# Altium schematic symbol library FPGA_Xilinx_Virtex7.SchLib: 34 symbols (part 18 of 26)
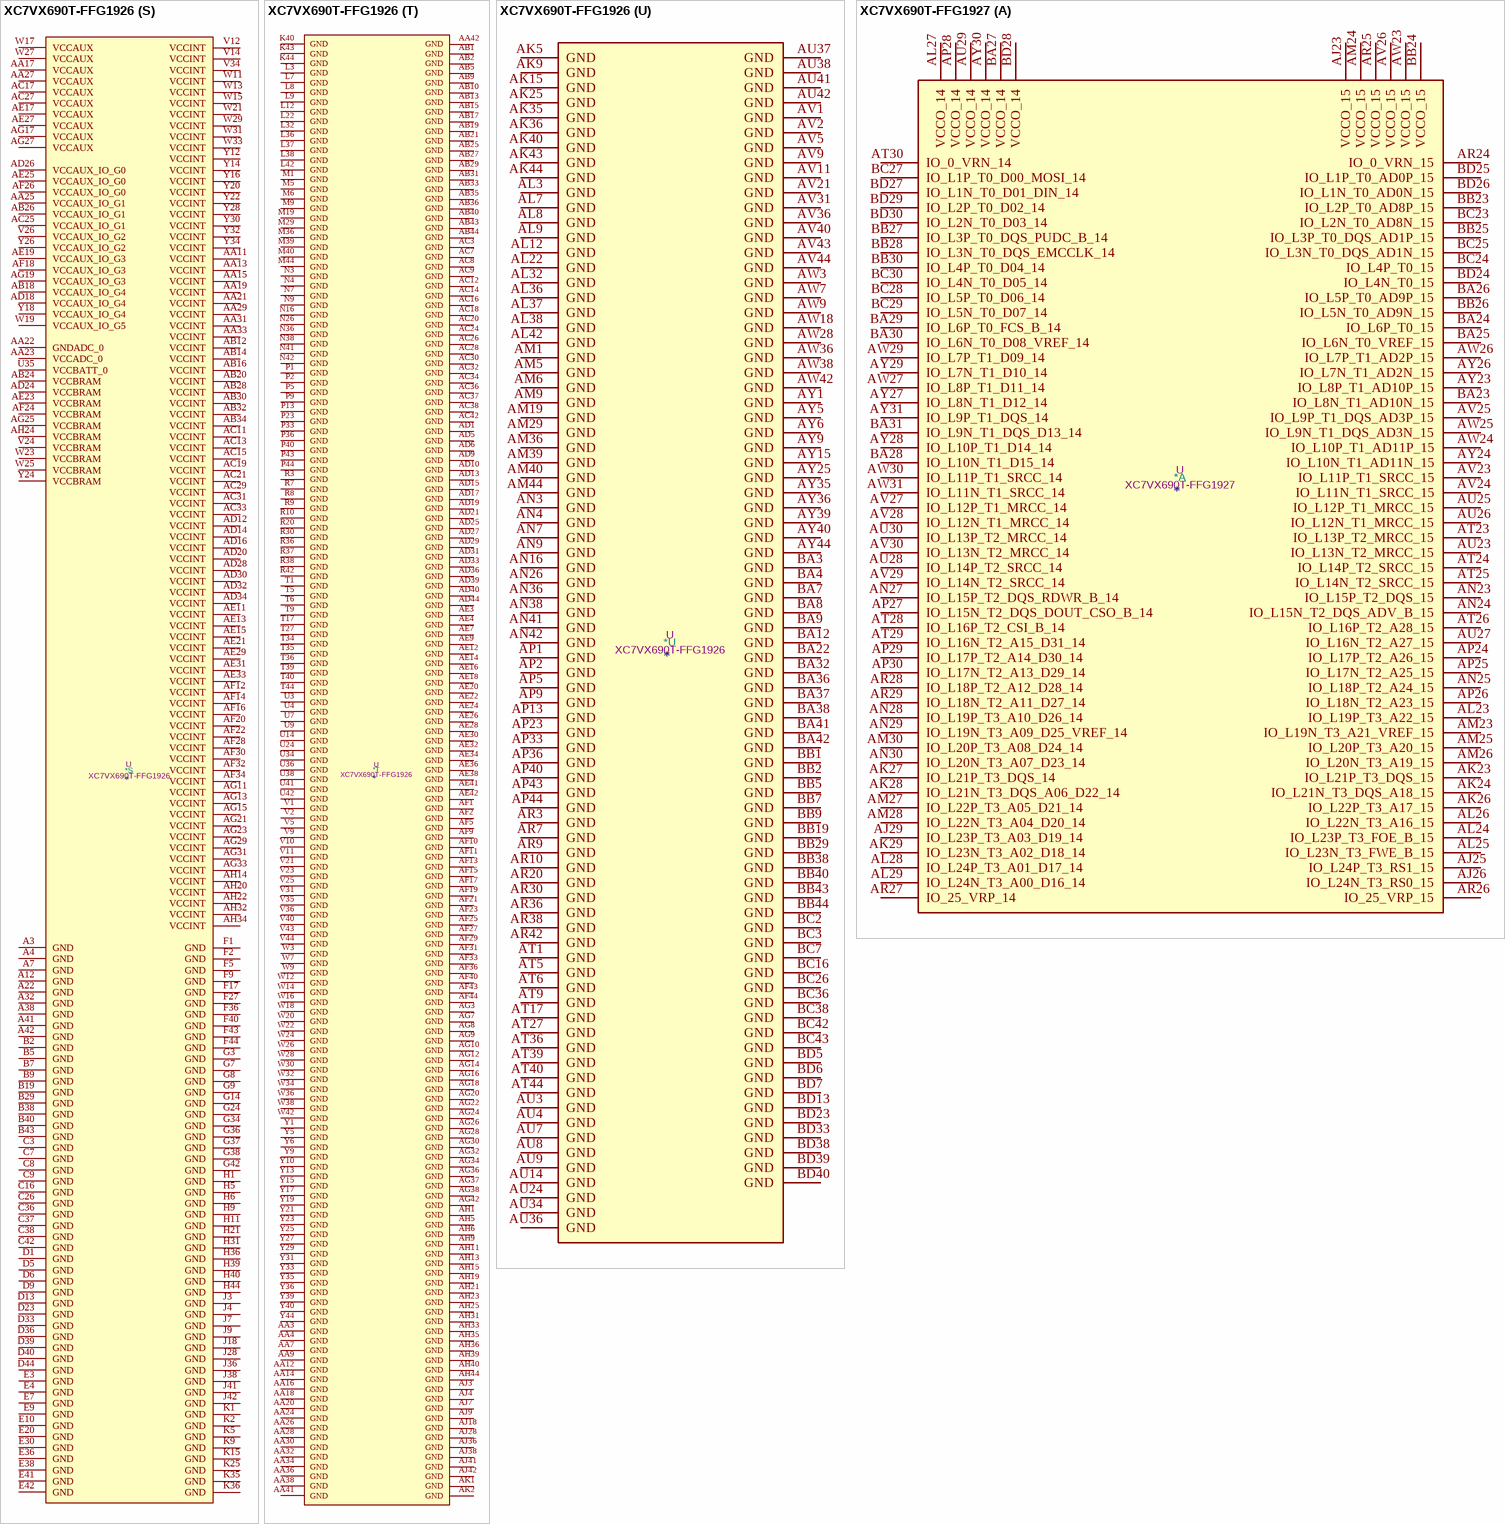
[diagram p189: symbols XC7VX690T-FFG1926 to XC7VX690T-FFG1927]

## XC7VX690T-FFG1926
designator *  value XC7VX690T-FFG1926  Reference: U
ki_keywords: FPGA; ki_description: Virtex 7 XT 690 XC7VX690T-FFG1926
part A pins: AH26 VCCO_11, AH27 IO_L1P_T0_11, AH28 IO_L1N_T0_11, AH29 IO_L3P_T0_DQS_11, AH30 IO_0_VRN_10, AJ26 IO_L2P_T0_11, AJ27 IO_L2N_T0_11, AJ29 IO_L3N_T0_DQS_11, AJ30 IO_L2P_T0_10, AJ31 IO_L2N_T0_10, AK26 IO_L6P_T0_11, AK27 IO_L4P_T0_11, AK28 IO_L4N_T0_11, AK29 IO_L5P_T0_11, AK30 VCCO_10, AK31 IO_L1P_T0_10, AL25 IO_0_VRN_11, AL26 IO_L6N_T0_VREF_11, AL27 VCCO_11, AL28 IO_25_VRP_11, AL29 IO_L5N_T0_11, AL30 IO_L4P_T0_10, AL31 IO_L1N_T0_10, AM25 IO_L8P_T1_11, AM26 IO_L8N_T1_11, AM27 IO_L7P_T1_11, AM28 IO_L7N_T1_11, AM30 IO_L3P_T0_DQS_10, AM31 IO_L4N_T0_10, AM32 IO_L5P_T0_10, AN25 IO_L10P_T1_11, AN27 IO_L9P_T1_DQS_11, AN28 IO_L9N_T1_DQS_11, AN29 IO_L6P_T0_10, AN30 IO_L3N_T0_DQS_10, AN31 VCCO_10, AN32 IO_L5N_T0_10, AP25 IO_L10N_T1_11, AP26 IO_L12P_T1_MRCC_11, AP27 IO_L12N_T1_MRCC_11, AP28 VCCO_11, AP29 IO_25_VRP_10, AP30 IO_L6N_T0_VREF_10, AP31 IO_L15P_T2_DQS_10, AR25 VCCO_11, AR26 IO_L13P_T2_MRCC_11, AR27 IO_L11P_T1_SRCC_11, AR28 IO_L11N_T1_SRCC_11, AR29 IO_L16P_T2_10, AR31 IO_L15N_T2_DQS_10, AT25 IO_L14P_T2_SRCC_11, AT26 IO_L13N_T2_MRCC_11, AT28 IO_L18P_T2_10, AT29 IO_L18N_T2_10, AT30 IO_L16N_T2_10, AT31 IO_L17P_T2_10, AU25 IO_L15P_T2_DQS_11, AU26 IO_L14N_T2_SRCC_11, AU27 IO_L18P_T2_11, AU28 IO_L14P_T2_SRCC_10, AU29 VCCO_10, AU30 IO_L13P_T2_MRCC_10, AU31 IO_L17N_T2_10, AV25 IO_L15N_T2_DQS_11, AV26 VCCO_11, AV27 IO_L18N_T2_11, AV28 IO_L14N_T2_SRCC_10, AV29 IO_L11P_T1_SRCC_10, AV30 IO_L13N_T2_MRCC_10, AW25 IO_L17P_T2_11, AW26 IO_L17N_T2_11, AW27 IO_L16P_T2_11, AW29 IO_L11N_T1_SRCC_10, AW30 IO_L12P_T1_MRCC_10, AW31 IO_L12N_T1_MRCC_10, AY26 IO_L19P_T3_11, AY27 IO_L16N_T2_11, AY28 IO_L7P_T1_10, AY29 IO_L9P_T1_DQS_10, AY30 VCCO_10, AY31 IO_L10P_T1_10, AY32 IO_L10N_T1_10, BA25 IO_L22P_T3_11, BA26 IO_L19N_T3_VREF_11, BA27 VCCO_11, BA28 IO_L7N_T1_10, BA29 IO_L9N_T1_DQS_10, BA30 IO_L8P_T1_10, BA31 IO_L8N_T1_10, BB24 VCCO_11, BB25 IO_L22N_T3_11, BB26 IO_L23P_T3_11, BB27 IO_L23N_T3_11, BB28 IO_L20P_T3_10, BB30 IO_L19P_T3_10, BB31 IO_L19N_T3_VREF_10, BB32 IO_L23P_T3_10, BC25 IO_L21P_T3_DQS_11, BC27 IO_L24P_T3_11, BC28 IO_L20N_T3_10, BC29 IO_L22P_T3_10, BC30 IO_L24P_T3_10, BC31 VCCO_10, BC32 IO_L23N_T3_10, BD24 IO_L20P_T3_11, BD25 IO_L20N_T3_11, BD26 IO_L21N_T3_DQS_11, BD27 IO_L24N_T3_11, BD28 VCCO_10, BD29 IO_L22N_T3_10, BD30 IO_L24N_T3_10, BD31 IO_L21P_T3_DQS_10, BD32 IO_L21N_T3_DQS_10
part B pins: A23 IO_L24P_T3_13, A24 IO_L24N_T3_13, A25 IO_L22P_T3_13, A26 IO_L22N_T3_13, AJ21 IO_0_VRN_12, AJ22 IO_L4P_T0_12, AJ23 VCCO_12, AJ24 IO_L1N_T0_12, AJ25 IO_L1P_T0_12, AK21 IO_L2P_T0_12, AK22 IO_L4N_T0_12, AK23 IO_L3N_T0_DQS_12, AK24 IO_L3P_T0_DQS_12, AL21 IO_L2N_T0_12, AL23 IO_L5P_T0_12, AL24 IO_25_VRP_12, AM21 IO_L6N_T0_VREF_12, AM22 IO_L6P_T0_12, AM23 IO_L5N_T0_12, AM24 VCCO_12, AN21 VCCO_12, AN22 IO_L10N_T1_12, AN23 IO_L10P_T1_12, AN24 IO_L7P_T1_12, AP21 IO_L8N_T1_12, AP22 IO_L8P_T1_12, AP24 IO_L7N_T1_12, AR21 IO_L12N_T1_MRCC_12, AR22 IO_L12P_T1_MRCC_12, AR23 IO_L9N_T1_DQS_12, AR24 IO_L9P_T1_DQS_12, AT21 IO_L13P_T2_MRCC_12, AT22 VCCO_12, AT23 IO_L11N_T1_SRCC_12, AT24 IO_L11P_T1_SRCC_12, AU21 IO_L13N_T2_MRCC_12, AU22 IO_L14N_T2_SRCC_12, AU23 IO_L14P_T2_SRCC_12, AV22 IO_L16N_T2_12, AV23 IO_L16P_T2_12, AV24 IO_L18P_T2_12, AW21 IO_L15N_T2_DQS_12, AW22 IO_L15P_T2_DQS_12, AW23 VCCO_12, AW24 IO_L18N_T2_12, AY21 IO_L17N_T2_12, AY22 IO_L17P_T2_12, AY23 IO_L19N_T3_VREF_12, AY24 IO_L19P_T3_12, B24 VCCO_13, B25 IO_L20P_T3_13, B26 IO_L20N_T3_13, BA21 IO_L20P_T3_12, BA23 IO_L21N_T3_DQS_12, BA24 IO_L21P_T3_DQS_12, BB21 IO_L20N_T3_12, BB22 IO_L23N_T3_12, BB23 IO_L23P_T3_12, BC21 VCCO_12, BC22 IO_L22P_T3_12, BC23 IO_L24N_T3_12, BC24 IO_L24P_T3_12, BD22 IO_L22N_T3_12, C24 IO_L23P_T3_13, C25 IO_L23N_T3_13, D24 IO_L21P_T3_DQS_13, D25 IO_L21N_T3_DQS_13, D26 IO_L19N_T3_VREF_13, E24 IO_L18N_T2_13, E25 VCCO_13, E26 IO_L19P_T3_13, F24 IO_L18P_T2_13, F25 IO_L16P_T2_13, F26 IO_L16N_T2_13, G25 IO_L17P_T2_13, G26 IO_L17N_T2_13, H24 IO_L15P_T2_DQS_13, H25 IO_L15N_T2_DQS_13, H26 VCCO_13, H27 IO_L13N_T2_MRCC_13, J24 IO_L14P_T2_SRCC_13, J25 IO_L14N_T2_SRCC_13, J26 IO_L11N_T1_SRCC_13, J27 IO_L13P_T2_MRCC_13, K24 IO_L9N_T1_DQS_13, K26 IO_L11P_T1_SRCC_13, K27 IO_L12N_T1_MRCC_13, L24 IO_L9P_T1_DQS_13, L25 IO_L7N_T1_13, L26 IO_L12P_T1_MRCC_13, L27 VCCO_13, M24 VCCO_13, M25 IO_L7P_T1_13, M26 IO_L10P_T1_13, M27 IO_L10N_T1_13, N24 IO_L8P_T1_13, N25 IO_L8N_T1_13, N27 IO_0_VRN_13, P24 IO_L5P_T0_13, P25 IO_L5N_T0_13, P26 IO_L3P_T0_DQS_13, P27 IO_L3N_T0_DQS_13, R24 IO_L6N_T0_VREF_13, R25 VCCO_13, R26 IO_L1P_T0_13, R27 IO_L1N_T0_13, T24 IO_L6P_T0_13, T25 IO_L4P_T0_13, T26 IO_L4N_T0_13, U25 IO_25_VRP_13, U26 IO_L2P_T0_13, U27 IO_L2N_T0_13
part C pins: A31 IO_L1N_T0_AD0N_15, AJ32 IO_L4P_T0_D04_14, AJ33 VCCO_14, AJ34 IO_L2P_T0_D02_14, AJ35 IO_0_VRN_14, AK32 IO_L4N_T0_D05_14, AK33 IO_L6P_T0_FCS_B_14, AK34 IO_L2N_T0_D03_14, AL33 IO_L3P_T0_DQS_PUDC_B_14, AL34 IO_L6N_T0_D08_VREF_14, AL35 IO_L5P_T0_D06_14, AM33 IO_L3N_T0_DQS_EMCCLK_14, AM34 VCCO_14, AM35 IO_L5N_T0_D07_14, AN33 IO_25_VRP_14, AN34 IO_L1P_T0_D00_MOSI_14, AN35 IO_L1N_T0_D01_DIN_14, AP32 IO_L7P_T1_D09_14, AP34 IO_L8P_T1_D11_14, AP35 IO_L8N_T1_D12_14, AR32 IO_L7N_T1_D10_14, AR33 IO_L10P_T1_D14_14, AR34 IO_L10N_T1_D15_14, AR35 VCCO_14, AT32 VCCO_14, AT33 IO_L9P_T1_DQS_14, AT34 IO_L9N_T1_DQS_D13_14, AT35 IO_L12P_T1_MRCC_14, AU32 IO_L11P_T1_SRCC_14, AU33 IO_L11N_T1_SRCC_14, AU35 IO_L12N_T1_MRCC_14, AV32 IO_L14P_T2_SRCC_14, AV33 IO_L13P_T2_MRCC_14, AV34 IO_L13N_T2_MRCC_14, AV35 IO_L15P_T2_DQS_RDWR_B_14, AW32 IO_L14N_T2_SRCC_14, AW33 VCCO_14, AW34 IO_L17P_T2_A14_D30_14, AW35 IO_L15N_T2_DQS_DOUT_CSO_B_14, AY33 IO_L16P_T2_CSI_B_14, AY34 IO_L17N_T2_A13_D29_14, B31 IO_L1P_T0_AD0P_15, B32 IO_L3N_T0_DQS_AD1N_15, BA33 IO_L16N_T2_A15_D31_14, BA34 IO_L18P_T2_A12_D28_14, BA35 IO_L18N_T2_A11_D27_14, BB33 IO_L20P_T3_A08_D24_14, BB34 VCCO_14, BB35 IO_L19P_T3_A10_D26_14, BB36 IO_L19N_T3_A09_D25_VREF_14, BB37 IO_L21P_T3_DQS_14, BC33 IO_L20N_T3_A07_D23_14, BC34 IO_L22P_T3_A05_D21_14, BC35 IO_L22N_T3_A04_D20_14, BC37 IO_L21N_T3_DQS_A06_D22_14, BD34 IO_L24P_T3_A01_D17_14, BD35 IO_L24N_T3_A00_D16_14, BD36 IO_L23P_T3_A03_D19_14, BD37 IO_L23N_T3_A02_D18_14, C31 VCCO_15, C32 IO_L3P_T0_DQS_AD1P_15, D31 IO_L5N_T0_AD9N_15, D32 IO_L4N_T0_15, E31 IO_L5P_T0_AD9P_15, E32 IO_L4P_T0_15, F31 IO_L2N_T0_AD8N_15, F32 VCCO_15, G31 IO_L2P_T0_AD8P_15, G32 IO_L6P_T0_15, G33 IO_L6N_T0_VREF_15, H32 IO_L9N_T1_DQS_AD3N_15, H33 IO_L8P_T1_AD10P_15, H34 IO_L8N_T1_AD10N_15, J31 IO_L7N_T1_AD2N_15, J32 IO_L9P_T1_DQS_AD3P_15, J33 VCCO_15, J34 IO_L10P_T1_AD11P_15, J35 IO_L10N_T1_AD11N_15, K31 IO_L7P_T1_AD2P_15, K32 IO_L11N_T1_SRCC_15, K33 IO_L12P_T1_MRCC_15, K34 IO_L12N_T1_MRCC_15, L31 IO_L11P_T1_SRCC_15, L33 IO_L13P_T2_MRCC_15, L34 IO_L13N_T2_MRCC_15, L35 IO_L16N_T2_A27_15, M31 IO_L14P_T2_SRCC_15, M32 IO_L14N_T2_SRCC_15, M33 IO_L18N_T2_A23_15, M34 VCCO_15, M35 IO_L16P_T2_A28_15, N31 VCCO_15, N32 IO_L17N_T2_A25_15, N33 IO_L18P_T2_A24_15, N34 IO_L15P_T2_DQS_15, N35 IO_L15N_T2_DQS_ADV_B_15, P31 IO_L20N_T3_A19_15, P32 IO_L17P_T2_A26_15, P34 IO_L24N_T3_RS0_15, P35 IO_0_VRN_15, R31 IO_L20P_T3_A20_15, R32 IO_L22P_T3_A17_15, R33 IO_L22N_T3_A16_15, R34 IO_L24P_T3_RS1_15, R35 VCCO_15, T31 IO_L19N_T3_A21_VREF_15, T32 VCCO_15, T33 IO_L21N_T3_DQS_A18_15, U31 IO_L19P_T3_A22_15, U32 IO_L21P_T3_DQS_15, U33 IO_L23N_T3_FWE_B_15, V32 IO_25_VRP_15, V33 IO_L23P_T3_FOE_B_15
part D pins: A27 VCCO_16, A28 IO_L24P_T3_16, A29 IO_L24N_T3_16, A30 IO_L23N_T3_16, A33 IO_L16P_T2_17, A34 IO_L16N_T2_17, A35 IO_L15P_T2_DQS_17, A36 IO_L15N_T2_DQS_17, A37 VCCO_17, B27 IO_L22P_T3_16, B28 IO_L22N_T3_16, B30 IO_L23P_T3_16, B33 IO_L6N_T0_VREF_17, B34 VCCO_17, B35 IO_L18P_T2_17, B36 IO_L17P_T2_17, B37 IO_L17N_T2_17, C27 IO_L20P_T3_16, C28 IO_L20N_T3_16, C29 IO_L21P_T3_DQS_16, C30 IO_L21N_T3_DQS_16, C33 IO_L12P_T1_MRCC_17, C34 IO_L12N_T1_MRCC_17, C35 IO_L11N_T1_SRCC_17, D27 IO_L18N_T2_16, D28 VCCO_16, D29 IO_L19P_T3_16, D30 IO_L19N_T3_VREF_16, D34 IO_L13N_T2_MRCC_17, D35 IO_L11P_T1_SRCC_17, E27 IO_L18P_T2_16, E28 IO_L16P_T2_16, E29 IO_L16N_T2_16, E33 IO_L13P_T2_MRCC_17, E34 IO_L14N_T2_SRCC_17, E35 VCCO_17, F28 IO_L17P_T2_16, F29 IO_L17N_T2_16, F30 IO_L15N_T2_DQS_16, F33 IO_0_VRN_17, F34 IO_L14P_T2_SRCC_17, F35 IO_L19N_T3_VREF_17, G27 IO_L14P_T2_SRCC_16, G28 IO_L14N_T2_SRCC_16, G29 VCCO_16, G30 IO_L15P_T2_DQS_16, G35 IO_L19P_T3_17, H28 IO_L13P_T2_MRCC_16, H29 IO_L13N_T2_MRCC_16, H30 IO_L11N_T1_SRCC_16, H35 IO_25_VRP_17, J29 IO_L12N_T1_MRCC_16, J30 IO_L11P_T1_SRCC_16, K28 IO_L10N_T1_16, K29 IO_L12P_T1_MRCC_16, K30 VCCO_16, L28 IO_L10P_T1_16, L29 IO_L9P_T1_DQS_16, L30 IO_L9N_T1_DQS_16, M28 IO_L8N_T1_16, M30 IO_L7N_T1_16, N28 IO_L8P_T1_16, N29 IO_L6N_T0_VREF_16, N30 IO_L7P_T1_16, P28 VCCO_16, P29 IO_L6P_T0_16, P30 IO_25_VRP_16, R28 IO_L4P_T0_16, R29 IO_L4N_T0_16, T28 IO_L2P_T0_16, T29 IO_L2N_T0_16, T30 IO_L5N_T0_16, U28 IO_L3N_T0_DQS_16, U29 VCCO_16, U30 IO_L5P_T0_16, V27 IO_0_VRN_16, V28 IO_L3P_T0_DQS_16, V29 IO_L1P_T0_16, V30 IO_L1N_T0_16
part E pins: AH16 VCCO_30, AH17 IO_L2N_T0_31, AH18 IO_L2P_T0_31, AJ14 IO_0_VRN_30, AJ15 IO_L2N_T0_30, AJ16 IO_L2P_T0_30, AJ17 IO_0_VRN_31, AJ19 IO_L4N_T0_31, AJ20 IO_L4P_T0_31, AK14 IO_L4P_T0_30, AK16 IO_L1P_T0_30, AK17 IO_L1N_T0_31, AK18 IO_L1P_T0_31, AK19 IO_L6P_T0_31, AK20 VCCO_31, AL14 IO_L4N_T0_30, AL15 IO_L3P_T0_DQS_30, AL16 IO_L1N_T0_30, AL17 VCCO_31, AL18 IO_L3P_T0_DQS_31, AL19 IO_L6N_T0_VREF_31, AL20 IO_L5P_T0_31, AM14 VCCO_30, AM15 IO_L3N_T0_DQS_30, AM16 IO_25_VRP_30, AM17 IO_L10P_T1_31, AM18 IO_L3N_T0_DQS_31, AM20 IO_L5N_T0_31, AN14 IO_L5N_T0_30, AN15 IO_L5P_T0_30, AN17 IO_L10N_T1_31, AN18 IO_L7N_T1_31, AN19 IO_L7P_T1_31, AN20 IO_25_VRP_31, AP14 IO_L15P_T2_DQS_30, AP15 IO_L6N_T0_VREF_30, AP16 IO_L6P_T0_30, AP17 IO_L8P_T1_31, AP18 VCCO_31, AP19 IO_L9N_T1_DQS_31, AP20 IO_L9P_T1_DQS_31, AR14 IO_L15N_T2_DQS_30, AR15 VCCO_30, AR16 IO_L16P_T2_30, AR17 IO_L8N_T1_31, AR18 IO_L11N_T1_SRCC_31, AR19 IO_L11P_T1_SRCC_31, AT13 IO_L17N_T2_30, AT14 IO_L17P_T2_30, AT15 IO_L16N_T2_30, AT16 IO_L18P_T2_30, AT18 IO_L12N_T1_MRCC_31, AT19 IO_L12P_T1_MRCC_31, AT20 IO_L13P_T2_MRCC_31, AU13 IO_L13P_T2_MRCC_30, AU15 IO_L14P_T2_SRCC_30, AU16 IO_L18N_T2_30, AU17 IO_L14N_T2_SRCC_31, AU18 IO_L14P_T2_SRCC_31, AU19 VCCO_31, AU20 IO_L13N_T2_MRCC_31, AV13 IO_L13N_T2_MRCC_30, AV14 IO_L12P_T1_MRCC_30, AV15 IO_L14N_T2_SRCC_30, AV16 VCCO_30, AV17 IO_L17P_T2_31, AV18 IO_L15N_T2_DQS_31, AV19 IO_L15P_T2_DQS_31, AV20 IO_L16P_T2_31, AW13 VCCO_30, AW14 IO_L12N_T1_MRCC_30, AW15 IO_L11N_T1_SRCC_30, AW16 IO_L11P_T1_SRCC_30, AW17 IO_L17N_T2_31, AW19 IO_L18P_T2_31, AW20 IO_L16N_T2_31, AY13 IO_L10P_T1_30, AY14 IO_L8P_T1_30, AY16 IO_L7N_T1_30, AY17 IO_L7P_T1_30, AY18 IO_L19P_T3_31, AY19 IO_L18N_T2_31, AY20 VCCO_31, BA13 IO_L10N_T1_30, BA14 IO_L8N_T1_30, BA15 IO_L9N_T1_DQS_30, BA16 IO_L9P_T1_DQS_30, BA17 VCCO_30, BA18 IO_L19N_T3_VREF_31, BA19 IO_L21N_T3_DQS_31, BA20 IO_L21P_T3_DQS_31, BB13 IO_L23P_T3_30, BB14 VCCO_30, BB15 IO_L19N_T3_VREF_30, BB16 IO_L19P_T3_30, BB17 IO_L20P_T3_30, BB18 IO_L23P_T3_31, BB20 IO_L20P_T3_31, BC13 IO_L23N_T3_30, BC14 IO_L24N_T3_30, BC15 IO_L24P_T3_30, BC17 IO_L20N_T3_30, BC18 IO_L23N_T3_31, BC19 IO_L24P_T3_31, BC20 IO_L20N_T3_31, BD14 IO_L21N_T3_DQS_30, BD15 IO_L21P_T3_DQS_30, BD16 IO_L22N_T3_30, BD17 IO_L22P_T3_30, BD18 VCCO_31, BD19 IO_L24N_T3_31, BD20 IO_L22N_T3_31, BD21 IO_L22P_T3_31
part F pins: A20 IO_L24N_T3_33, A21 IO_L24P_T3_33, AH10 IO_0_VRN_32, AH12 IO_L2P_T0_32, AJ10 IO_L4N_T0_32, AJ11 IO_L4P_T0_32, AJ12 IO_L2N_T0_32, AJ13 VCCO_32, AK10 VCCO_32, AK11 IO_L1P_T0_32, AK12 IO_L6N_T0_VREF_32, AK13 IO_L6P_T0_32, AL10 IO_L3P_T0_DQS_32, AL11 IO_L1N_T0_32, AL13 IO_25_VRP_32, AM10 IO_L3N_T0_DQS_32, AM11 IO_L5N_T0_32, AM12 IO_L5P_T0_32, AM13 IO_L8P_T1_32, AN10 IO_L7P_T1_32, AN11 VCCO_32, AN12 IO_L10P_T1_32, AN13 IO_L8N_T1_32, AP10 IO_L7N_T1_32, AP11 IO_L9P_T1_DQS_32, AP12 IO_L10N_T1_32, AR11 IO_L9N_T1_DQS_32, AR12 IO_L12N_T1_MRCC_32, AR13 IO_L12P_T1_MRCC_32, AT10 IO_L11N_T1_SRCC_32, AT11 IO_L11P_T1_SRCC_32, AT12 VCCO_32, AU10 IO_L13N_T2_MRCC_32, AU11 IO_L13P_T2_MRCC_32, AU12 IO_L14P_T2_SRCC_32, AV10 IO_L15P_T2_DQS_32, AV12 IO_L14N_T2_SRCC_32, AW10 IO_L15N_T2_DQS_32, AW11 IO_L16P_T2_32, AW12 IO_L18P_T2_32, AY10 VCCO_32, AY11 IO_L16N_T2_32, AY12 IO_L18N_T2_32, B20 IO_L23N_T3_33, B21 IO_L23P_T3_33, B22 IO_L20N_T3_33, B23 IO_L22N_T3_33, BA10 IO_L17N_T2_32, BA11 IO_L17P_T2_32, BB8 IO_L21P_T3_DQS_32, BB10 IO_L19N_T3_VREF_32, BB11 IO_L19P_T3_32, BB12 IO_L22P_T3_32, BC8 IO_L21N_T3_DQS_32, BC9 IO_L23N_T3_32, BC10 IO_L23P_T3_32, BC11 VCCO_32, BC12 IO_L22N_T3_32, BD8 VCCO_32, BD9 IO_L20N_T3_32, BD10 IO_L20P_T3_32, BD11 IO_L24N_T3_32, BD12 IO_L24P_T3_32, C21 VCCO_33, C22 IO_L20P_T3_33, C23 IO_L22P_T3_33, D21 IO_L21N_T3_DQS_33, D22 IO_L21P_T3_DQS_33, E21 IO_L19N_T3_VREF_33, E22 IO_L19P_T3_33, E23 IO_L18N_T2_33, F21 IO_L15N_T2_DQS_33, F22 VCCO_33, F23 IO_L18P_T2_33, G21 IO_L15P_T2_DQS_33, G22 IO_L17N_T2_33, G23 IO_L16N_T2_33, H22 IO_L17P_T2_33, H23 IO_L16P_T2_33, J21 IO_L13N_T2_MRCC_33, J22 IO_L13P_T2_MRCC_33, J23 VCCO_33, K20 VCCO_33, K21 IO_L12N_T1_MRCC_33, K22 IO_L14N_T2_SRCC_33, K23 IO_L14P_T2_SRCC_33, L20 IO_L10N_T1_33, L21 IO_L12P_T1_MRCC_33, L23 IO_L11N_T1_SRCC_33, M20 IO_L10P_T1_33, M21 IO_L7N_T1_33, M22 IO_L7P_T1_33, M23 IO_L11P_T1_SRCC_33, N20 IO_L8N_T1_33, N21 VCCO_33, N22 IO_L9N_T1_DQS_33, N23 IO_L9P_T1_DQS_33, P20 IO_L8P_T1_33, P21 IO_L6N_T0_VREF_33, P22 IO_L1N_T0_33, R21 IO_L6P_T0_33, R22 IO_L1P_T0_33, R23 IO_25_VRP_33, T20 IO_L2N_T0_33, T21 IO_L4N_T0_33, T22 VCCO_33, T23 IO_L3N_T0_DQS_33, U20 IO_L2P_T0_33, U21 IO_L4P_T0_33, U22 IO_L5N_T0_33, U23 IO_L3P_T0_DQS_33, V20 IO_0_VRN_33, V22 IO_L5P_T0_33
part G pins: A13 IO_L2N_T0_34, A14 IO_L5N_T0_34, A15 IO_L5P_T0_34, A16 IO_L1N_T0_34, A17 VCCO_35, A18 IO_L24N_T3_35, A19 IO_L24P_T3_35, B12 IO_L4N_T0_34, B13 IO_L2P_T0_34, B14 VCCO_34, B15 IO_L3N_T0_DQS_34, B16 IO_L1P_T0_34, B17 IO_L23N_T3_35, B18 IO_L23P_T3_35, C12 IO_L4P_T0_34, C13 IO_L6N_T0_VREF_34, C14 IO_L6P_T0_34, C15 IO_L3P_T0_DQS_34, C17 IO_L21N_T3_DQS_35, C18 IO_L21P_T3_DQS_35, C19 IO_L22N_T3_35, C20 IO_L22P_T3_35, D14 IO_L10N_T1_34, D15 IO_L10P_T1_34, D16 IO_L19N_T3_VREF_35, D17 IO_L19P_T3_35, D18 VCCO_35, D19 IO_L20N_T3_35, D20 IO_L20P_T3_35, E13 IO_L7N_T1_34, E14 IO_L7P_T1_34, E15 VCCO_34, E16 IO_L8N_T1_34, E17 IO_L18N_T2_35, E18 IO_L18P_T2_35, E19 IO_L17N_T2_35, F13 IO_L11N_T1_SRCC_34, F14 IO_L9N_T1_DQS_34, F15 IO_L9P_T1_DQS_34, F16 IO_L8P_T1_34, F18 IO_L15N_T2_DQS_35, F19 IO_L17P_T2_35, F20 IO_L16N_T2_35, G13 IO_L11P_T1_SRCC_34, G15 IO_L12N_T1_MRCC_34, G16 IO_L12P_T1_MRCC_34, G17 IO_L14N_T2_SRCC_35, G18 IO_L15P_T2_DQS_35, G19 VCCO_35, G20 IO_L16P_T2_35, H13 IO_L14N_T2_SRCC_34, H14 IO_L14P_T2_SRCC_34, H15 IO_L13N_T2_MRCC_34, H16 VCCO_34, H17 IO_L14P_T2_SRCC_35, H18 IO_L13N_T2_MRCC_35, H19 IO_L13P_T2_MRCC_35, H20 IO_L11N_T1_SRCC_35, J14 IO_L15N_T2_DQS_34, J15 IO_L13P_T2_MRCC_34, J16 IO_L16N_T2_34, J17 IO_L9N_T1_DQS_AD7N_35, J19 IO_L12N_T1_MRCC_35, J20 IO_L11P_T1_SRCC_35, K14 IO_L15P_T2_DQS_34, K16 IO_L16P_T2_34, K17 IO_L9P_T1_DQS_AD7P_35, K18 IO_L7N_T1_AD6N_35, K19 IO_L12P_T1_MRCC_35, L14 IO_L17N_T2_34, L15 IO_L17P_T2_34, L16 IO_L18N_T2_34, L17 VCCO_35, L18 IO_L10N_T1_AD15N_35, L19 IO_L7P_T1_AD6P_35, M14 VCCO_34, M15 IO_L24N_T3_34, M16 IO_L18P_T2_34, M17 IO_L8N_T1_AD14N_35, M18 IO_L10P_T1_AD15P_35, N14 IO_L21N_T3_DQS_34, N15 IO_L24P_T3_34, N17 IO_L8P_T1_AD14P_35, N18 IO_L3N_T0_DQS_AD5N_35, N19 IO_L3P_T0_DQS_AD5P_35, P14 IO_L21P_T3_DQS_34, P15 IO_L22N_T3_34, P16 IO_L22P_T3_34, P17 IO_L1N_T0_AD4N_35, P18 VCCO_35, P19 IO_25_VRP_35, R14 IO_L23N_T3_34, R15 VCCO_34, R16 IO_0_VRN_34, R17 IO_L1P_T0_AD4P_35, R18 IO_L6N_T0_VREF_35, R19 IO_L5N_T0_AD13N_35, T14 IO_L23P_T3_34, T15 IO_L19N_T3_VREF_34, T16 IO_L20N_T3_34, T18 IO_L6P_T0_35, T19 IO_L5P_T0_AD13P_35, U15 IO_L19P_T3_34, U16 IO_L20P_T3_34, U17 IO_L4N_T0_35, U18 IO_L4P_T0_35, U19 VCCO_35, V15 IO_25_VRP_34, V16 VCCO_34, V17 IO_0_VRN_35, V18 IO_L2N_T0_AD12N_35, V19 IO_L2P_T0_AD12P_35
part H pins: A8 IO_L5N_T0_36, A9 IO_L3N_T0_DQS_36, A10 IO_L3P_T0_DQS_36, A11 IO_L1N_T0_36, B8 IO_L5P_T0_36, B10 IO_L4N_T0_36, B11 IO_L1P_T0_36, C10 IO_L4P_T0_36, C11 VCCO_36, D10 IO_L2N_T0_36, D11 IO_L2P_T0_36, D12 IO_L6N_T0_VREF_36, E11 IO_L8N_T1_36, E12 IO_L6P_T0_36, F10 IO_L10N_T1_36, F11 IO_L8P_T1_36, F12 VCCO_36, G10 IO_L10P_T1_36, G11 IO_L7N_T1_36, G12 IO_L7P_T1_36, H10 IO_L9N_T1_DQS_36, H12 IO_L11N_T1_SRCC_36, J10 IO_L9P_T1_DQS_36, J11 IO_L12N_T1_MRCC_36, J12 IO_L11P_T1_SRCC_36, J13 VCCO_36, K10 VCCO_36, K11 IO_L12P_T1_MRCC_36, K12 IO_L13N_T2_MRCC_36, K13 IO_L13P_T2_MRCC_36, L10 IO_L14N_T2_SRCC_36, L11 IO_L14P_T2_SRCC_36, L13 IO_L15N_T2_DQS_36, M10 IO_L18N_T2_36, M11 IO_L16N_T2_36, M12 IO_L16P_T2_36, M13 IO_L15P_T2_DQS_36, N10 IO_L18P_T2_36, N11 VCCO_36, N12 IO_L17N_T2_36, N13 IO_L17P_T2_36, P10 IO_0_VRN_36, P11 IO_L20N_T3_36, P12 IO_L20P_T3_36, R11 IO_L22N_T3_36, R12 IO_L22P_T3_36, R13 IO_L24N_T3_36, T10 IO_L19N_T3_VREF_36, T11 IO_L19P_T3_36, T12 VCCO_36, T13 IO_L24P_T3_36, U10 IO_L23N_T3_36, U11 IO_L23P_T3_36, U12 IO_L21N_T3_DQS_36, U13 IO_L21P_T3_DQS_36, V13 IO_25_VRP_36
part I pins: AN5 MGTHRXN3_112, AN6 MGTHRXP3_112, AP3 MGTHTXN3_112, AP4 MGTHTXP3_112, AP7 MGTREFCLK0N_112, AP8 MGTREFCLK0P_112, AR1 MGTHTXN2_112, AR2 MGTHTXP2_112, AR5 MGTHRXN2_112, AR6 MGTHRXP2_112, AT3 MGTHRXN1_112, AT4 MGTHRXP1_112, AT7 MGTREFCLK1N_112, AT8 MGTREFCLK1P_112, AU1 MGTHTXN1_112, AU2 MGTHTXP1_112, AU5 MGTHRXN0_112, AU6 MGTHRXP0_112, AV3 MGTHTXN0_112, AV4 MGTHTXP0_112, AV7 MGTREFCLK0N_111, AV8 MGTREFCLK0P_111, AW1 MGTHTXN3_111, AW2 MGTHTXP3_111, AW5 MGTHRXN3_111, AW6 MGTHRXP3_111, AY3 MGTHRXN2_111, AY4 MGTHRXP2_111, AY7 MGTREFCLK1N_111, AY8 MGTREFCLK1P_111, BA1 MGTHTXN2_111, BA2 MGTHTXP2_111, BA5 MGTHRXN1_111, BA6 MGTHRXP1_111, BB3 MGTHTXN1_111, BB4 MGTHTXP1_111, BC5 MGTHRXN0_111, BC6 MGTHRXP0_111, BD3 MGTHTXN0_111, BD4 MGTHTXP0_111
part J pins: AC1 MGTHTXN3_114, AC2 MGTHTXP3_114, AC5 MGTHRXN3_114, AC6 MGTHRXP3_114, AD3 MGTHRXN2_114, AD4 MGTHRXP2_114, AD7 MGTREFCLK0N_114, AD8 MGTREFCLK0P_114, AE1 MGTHTXN2_114, AE2 MGTHTXP2_114, AE5 MGTHRXN1_114, AE6 MGTHRXP1_114, AF3 MGTHTXN1_114, AF4 MGTHTXP1_114, AF7 MGTREFCLK1N_114, AF8 MGTREFCLK1P_114, AG1 MGTHTXN0_114, AG2 MGTHTXP0_114, AG5 MGTHRXN0_114, AG6 MGTHRXP0_114, AH3 MGTHRXN3_113, AH4 MGTHRXP3_113, AH7 MGTREFCLK0N_113, AH8 MGTREFCLK0P_113, AJ1 MGTHTXN3_113, AJ2 MGTHTXP3_113, AJ5 MGTHRXN2_113, AJ6 MGTHRXP2_113, AK3 MGTHTXN2_113, AK4 MGTHTXP2_113, AK7 MGTREFCLK1N_113, AK8 MGTREFCLK1P_113, AL1 MGTHTXN1_113, AL2 MGTHTXP1_113, AL5 MGTHRXN1_113, AL6 MGTHRXP1_113, AM3 MGTHRXN0_113, AM4 MGTHRXP0_113, AN1 MGTHTXN0_113, AN2 MGTHTXP0_113
part K pins: AA1 MGTHTXN1_115, AA2 MGTHTXP1_115, AA5 MGTHRXN0_115, AA6 MGTHRXP0_115, AB3 MGTHTXN0_115, AB4 MGTHTXP0_115, AB7 MGTREFCLK1N_115, AB8 MGTREFCLK1P_115, M3 MGTHRXN3_116, M4 MGTHRXP3_116, N1 MGTHTXN3_116, N2 MGTHTXP3_116, N5 MGTHRXN2_116, N6 MGTHRXP2_116, P3 MGTHTXN2_116, P4 MGTHTXP2_116, P7 MGTREFCLK0N_116, P8 MGTREFCLK0P_116, R1 MGTHTXN1_116, R2 MGTHTXP1_116, R5 MGTHRXN1_116, R6 MGTHRXP1_116, T3 MGTHRXN0_116, T4 MGTHRXP0_116, T7 MGTREFCLK1N_116, T8 MGTREFCLK1P_116, U1 MGTHTXN0_116, U2 MGTHTXP0_116, U5 MGTHRXN3_115, U6 MGTHRXP3_115, V3 MGTHTXN3_115, V4 MGTHTXP3_115, V7 MGTREFCLK0N_115, V8 MGTREFCLK0P_115, W1 MGTHTXN2_115, W2 MGTHTXP2_115, W5 MGTHRXN2_115, W6 MGTHRXP2_115, Y3 MGTHRXN1_115, Y4 MGTHRXP1_115
part L pins: A5 MGTHRXN3_118, A6 MGTHRXP3_118, B3 MGTHTXN3_118, B4 MGTHTXP3_118, C1 MGTHTXN2_118, C2 MGTHTXP2_118, C5 MGTHRXN2_118, C6 MGTHRXP2_118, D3 MGTHRXN1_118, D4 MGTHRXP1_118, D7 MGTREFCLK0N_118, D8 MGTREFCLK0P_118, E1 MGTHTXN1_118, E2 MGTHTXP1_118, E5 MGTHRXN0_118, E6 MGTHRXP0_118, F3 MGTHTXN0_118, F4 MGTHTXP0_118, F7 MGTREFCLK1N_118, F8 MGTREFCLK1P_118, G1 MGTHTXN3_117, G2 MGTHTXP3_117, G5 MGTHRXN3_117, G6 MGTHRXP3_117, H3 MGTHRXN2_117, H4 MGTHRXP2_117, J1 MGTHTXN2_117, J2 MGTHTXP2_117, J5 MGTHRXN1_117, J6 MGTHRXP1_117, K3 MGTHTXN1_117, K4 MGTHTXP1_117, K7 MGTREFCLK0N_117, K8 MGTREFCLK0P_117, L1 MGTHTXN0_117, L2 MGTHTXP0_117, L5 MGTHRXN0_117, L6 MGTHRXP0_117, M7 MGTREFCLK1N_117, M8 MGTREFCLK1P_117
part M pins: AN39 MGTHRXP3_212, AN40 MGTHRXN3_212, AP37 MGTREFCLK0P_212, AP38 MGTREFCLK0N_212, AP41 MGTHTXP3_212, AP42 MGTHTXN3_212, AR39 MGTHRXP2_212, AR40 MGTHRXN2_212, AR43 MGTHTXP2_212, AR44 MGTHTXN2_212, AT37 MGTREFCLK1P_212, AT38 MGTREFCLK1N_212, AT41 MGTHRXP1_212, AT42 MGTHRXN1_212, AU39 MGTHRXP0_212, AU40 MGTHRXN0_212, AU43 MGTHTXP1_212, AU44 MGTHTXN1_212, AV37 MGTREFCLK0P_211, AV38 MGTREFCLK0N_211, AV41 MGTHTXP0_212, AV42 MGTHTXN0_212, AW39 MGTHRXP3_211, AW40 MGTHRXN3_211, AW43 MGTHTXP3_211, AW44 MGTHTXN3_211, AY37 MGTREFCLK1P_211, AY38 MGTREFCLK1N_211, AY41 MGTHRXP2_211, AY42 MGTHRXN2_211, BA39 MGTHRXP1_211, BA40 MGTHRXN1_211, BA43 MGTHTXP2_211, BA44 MGTHTXN2_211, BB41 MGTHTXP1_211, BB42 MGTHTXN1_211, BC39 MGTHRXP0_211, BC40 MGTHRXN0_211, BD41 MGTHTXP0_211, BD42 MGTHTXN0_211
part N pins: AC39 MGTHRXP3_214, AC40 MGTHRXN3_214, AC43 MGTHTXP3_214, AC44 MGTHTXN3_214, AD37 MGTREFCLK0P_214, AD38 MGTREFCLK0N_214, AD41 MGTHRXP2_214, AD42 MGTHRXN2_214, AE39 MGTHRXP1_214, AE40 MGTHRXN1_214, AE43 MGTHTXP2_214, AE44 MGTHTXN2_214, AF37 MGTREFCLK1P_214, AF38 MGTREFCLK1N_214, AF41 MGTHTXP1_214, AF42 MGTHTXN1_214, AG39 MGTHRXP0_214, AG40 MGTHRXN0_214, AG43 MGTHTXP0_214, AG44 MGTHTXN0_214, AH37 MGTREFCLK0P_213, AH38 MGTREFCLK0N_213, AH41 MGTHRXP3_213, AH42 MGTHRXN3_213, AJ39 MGTHRXP2_213, AJ40 MGTHRXN2_213, AJ43 MGTHTXP3_213, AJ44 MGTHTXN3_213, AK37 MGTREFCLK1P_213, AK38 MGTREFCLK1N_213, AK41 MGTHTXP2_213, AK42 MGTHTXN2_213, AL39 MGTHRXP1_213, AL40 MGTHRXN1_213, AL43 MGTHTXP1_213, AL44 MGTHTXN1_213, AM41 MGTHRXP0_213, AM42 MGTHRXN0_213, AN43 MGTHTXP0_213, AN44 MGTHTXN0_213